# Altium schematic symbol library jlcpcb_2025_04_capacitors_extended_0402.schlib: 3594 symbols (part 7 of 20)
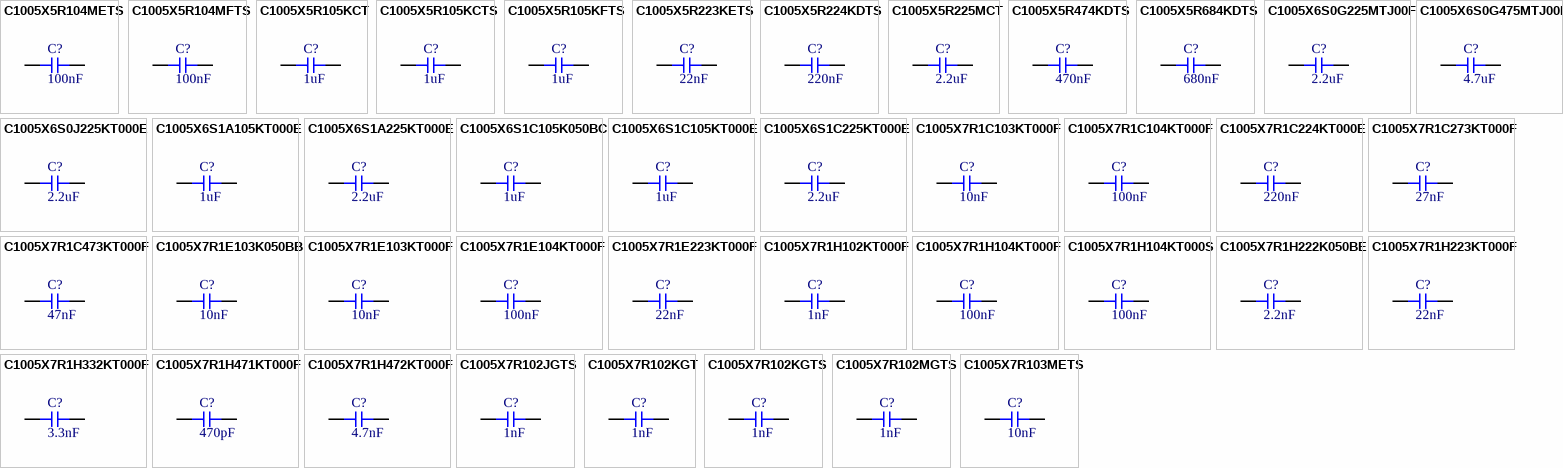
[diagram p95: symbols C1005X5R104METS to C1005X7R103METS]

## C1005X7R1H102KT000F
designator C?  Capacitance: 1nF  (hidden comment: *)
Capacitor, Ceramic (MLCC), 1nF, ±10%, 50V, X7R, ±10%, SMD 0402; Manufacturer: TDK; Manufacturer Part Number: C1005X7R1H102KT000F; Package Size: 0402; JLCPCB Basic Part: No; JLCPCB Part Number: C338013; Supplier 1: LCSC; Category: Capacitors - MLCC; Supplier Part Number 1: C338013; Tolerance: ±10%; Voltage Rating: 50V; Temperature Coefficient: X7R; RoHS: Yes; ComponentLink1Description: Datasheet; ComponentLink1URL: https://wmsc.lcsc.com/wmsc/upload/file/pdf/v2/lcsc/2304140030_TDK-C1005X7R1H102KT000F_C338013.pdf; ComponentLink2Description: JLCPCB Part URL; ComponentLink2URL: https://jlcpcb.com/partdetail/C338013; ComponentLink3Description: LCSC Part URL; ComponentLink3URL: https://lcsc.com/product-detail/Multilayer-Ceramic-Capacitors-MLCC---SMD-SMT_TDK-TDK-C1005X7R1H102KT000F_C338013.html
footprint CAP-0402 (0402 (1005M) Capacitor)
pins: 1, 2

## C1005X7R1H104KT000F
designator C?  Capacitance: 100nF  (hidden comment: *)
Capacitor, Ceramic (MLCC), 100nF, ±10%, 50V, X7R, ±10%, SMD 0402; Manufacturer: TDK; Manufacturer Part Number: C1005X7R1H104KT000F; Package Size: 0402; JLCPCB Basic Part: No; JLCPCB Part Number: C361198; Supplier 1: LCSC; Category: Capacitors - MLCC; Supplier Part Number 1: C361198; Tolerance: ±10%; Voltage Rating: 50V; Temperature Coefficient: X7R; RoHS: Yes; ComponentLink1Description: Datasheet; ComponentLink1URL: https://wmsc.lcsc.com/wmsc/upload/file/pdf/v2/lcsc/2304140030_TDK-C1005X7R1H104KT000F_C361198.pdf; ComponentLink2Description: JLCPCB Part URL; ComponentLink2URL: https://jlcpcb.com/partdetail/C361198; ComponentLink3Description: LCSC Part URL; ComponentLink3URL: https://lcsc.com/product-detail/Multilayer-Ceramic-Capacitors-MLCC---SMD-SMT_TDK-TDK-C1005X7R1H104KT000F_C361198.html
footprint CAP-0402 (0402 (1005M) Capacitor)
pins: 1, 2

## C1005X7R1H104KT000S
designator C?  Capacitance: 100nF  (hidden comment: *)
Capacitor, Ceramic (MLCC), 100nF, ±10%, 50V, X7R, ±10%, SMD 0402; Manufacturer: TDK; Manufacturer Part Number: C1005X7R1H104KT000S; Package Size: 0402; JLCPCB Basic Part: No; JLCPCB Part Number: C432917; Supplier 1: LCSC; Category: Capacitors - MLCC; Supplier Part Number 1: C432917; Tolerance: ±10%; Voltage Rating: 50V; Temperature Coefficient: X7R; RoHS: Yes; ComponentLink1Description: Datasheet; ComponentLink1URL: https://wmsc.lcsc.com/wmsc/upload/file/pdf/v2/lcsc/2304140030_TDK-C1005X7R1H104KT000S_C432917.pdf; ComponentLink2Description: JLCPCB Part URL; ComponentLink2URL: https://jlcpcb.com/partdetail/C432917; ComponentLink3Description: LCSC Part URL; ComponentLink3URL: https://lcsc.com/product-detail/Multilayer-Ceramic-Capacitors-MLCC---SMD-SMT_TDK-TDK-C1005X7R1H104KT000S_C432917.html
footprint CAP-0402 (0402 (1005M) Capacitor)
pins: 1, 2

## C1005X7R1H222K050BE
designator C?  Capacitance: 2.2nF  (hidden comment: *)
Capacitor, Ceramic (MLCC), 2.2nF, ±10%, 50V, X7R, ±10%, SMD 0402; Manufacturer: TDK; Manufacturer Part Number: C1005X7R1H222K050BE; Package Size: 0402; JLCPCB Basic Part: No; JLCPCB Part Number: C189394; Supplier 1: LCSC; Category: Capacitors - MLCC; Supplier Part Number 1: C189394; Tolerance: ±10%; Voltage Rating: 50V; Temperature Coefficient: X7R; RoHS: Yes; ComponentLink1Description: Datasheet; ComponentLink1URL: https://wmsc.lcsc.com/wmsc/upload/file/pdf/v2/lcsc/2304140030_TDK-C1005X7R1H222K050BE_C189394.pdf; ComponentLink2Description: JLCPCB Part URL; ComponentLink2URL: https://jlcpcb.com/partdetail/C189394; ComponentLink3Description: LCSC Part URL; ComponentLink3URL: https://lcsc.com/product-detail/Multilayer-Ceramic-Capacitors-MLCC---SMD-SMT_TDK-TDK-C1005X7R1H222K050BE_C189394.html
footprint CAP-0402 (0402 (1005M) Capacitor)
pins: 1, 2

## C1005X7R1H223KT000F
designator C?  Capacitance: 22nF  (hidden comment: *)
Capacitor, Ceramic (MLCC), 22nF, ±10%, 50V, X7R, ±10%, SMD 0402; Manufacturer: TDK; Manufacturer Part Number: C1005X7R1H223KT000F; Package Size: 0402; JLCPCB Basic Part: No; JLCPCB Part Number: C695127; Supplier 1: LCSC; Category: Capacitors - MLCC; Supplier Part Number 1: C695127; Tolerance: ±10%; Voltage Rating: 50V; Temperature Coefficient: X7R; RoHS: Yes; ComponentLink1Description: Datasheet; ComponentLink1URL: https://wmsc.lcsc.com/wmsc/upload/file/pdf/v2/lcsc/2304140030_TDK-C1005X7R1H223KT000F_C695127.pdf; ComponentLink2Description: JLCPCB Part URL; ComponentLink2URL: https://jlcpcb.com/partdetail/C695127; ComponentLink3Description: LCSC Part URL; ComponentLink3URL: https://lcsc.com/product-detail/Multilayer-Ceramic-Capacitors-MLCC---SMD-SMT_TDK-TDK-C1005X7R1H223KT000F_C695127.html
footprint CAP-0402 (0402 (1005M) Capacitor)
pins: 1, 2

## C1005X7R1H332KT000F
designator C?  Capacitance: 3.3nF  (hidden comment: *)
Capacitor, Ceramic (MLCC), 3.3nF, ±10%, 50V, X7R, ±10%, SMD 0402; Manufacturer: TDK; Manufacturer Part Number: C1005X7R1H332KT000F; Package Size: 0402; JLCPCB Basic Part: No; JLCPCB Part Number: C694172; Supplier 1: LCSC; Category: Capacitors - MLCC; Supplier Part Number 1: C694172; Tolerance: ±10%; Voltage Rating: 50V; Temperature Coefficient: X7R; RoHS: Yes; ComponentLink1Description: Datasheet; ComponentLink1URL: https://wmsc.lcsc.com/wmsc/upload/file/pdf/v2/lcsc/2304140030_TDK-C1005X7R1H332KT000F_C694172.pdf; ComponentLink2Description: JLCPCB Part URL; ComponentLink2URL: https://jlcpcb.com/partdetail/C694172; ComponentLink3Description: LCSC Part URL; ComponentLink3URL: https://lcsc.com/product-detail/Multilayer-Ceramic-Capacitors-MLCC---SMD-SMT_TDK-TDK-C1005X7R1H332KT000F_C694172.html
footprint CAP-0402 (0402 (1005M) Capacitor)
pins: 1, 2

## C1005X7R1H471KT000F
designator C?  Capacitance: 470pF  (hidden comment: *)
Capacitor, Ceramic (MLCC), 470pF, ±10%, 50V, X7R, ±10%, SMD 0402; Manufacturer: TDK; Manufacturer Part Number: C1005X7R1H471KT000F; Package Size: 0402; JLCPCB Basic Part: No; JLCPCB Part Number: C508852; Supplier 1: LCSC; Category: Capacitors - MLCC; Supplier Part Number 1: C508852; Tolerance: ±10%; Voltage Rating: 50V; Temperature Coefficient: X7R; RoHS: Yes; ComponentLink1Description: Datasheet; ComponentLink1URL: https://wmsc.lcsc.com/wmsc/upload/file/pdf/v2/lcsc/2304140030_TDK-C1005X7R1H471KT000F_C508852.pdf; ComponentLink2Description: JLCPCB Part URL; ComponentLink2URL: https://jlcpcb.com/partdetail/C508852; ComponentLink3Description: LCSC Part URL; ComponentLink3URL: https://lcsc.com/product-detail/Multilayer-Ceramic-Capacitors-MLCC---SMD-SMT_TDK-TDK-C1005X7R1H471KT000F_C508852.html
footprint CAP-0402 (0402 (1005M) Capacitor)
pins: 1, 2

## C1005X7R1H472KT000F
designator C?  Capacitance: 4.7nF  (hidden comment: *)
Capacitor, Ceramic (MLCC), 4.7nF, ±10%, 50V, X7R, ±10%, SMD 0402; Manufacturer: TDK; Manufacturer Part Number: C1005X7R1H472KT000F; Package Size: 0402; JLCPCB Basic Part: No; JLCPCB Part Number: C694277; Supplier 1: LCSC; Category: Capacitors - MLCC; Supplier Part Number 1: C694277; Tolerance: ±10%; Voltage Rating: 50V; Temperature Coefficient: X7R; RoHS: Yes; ComponentLink1Description: Datasheet; ComponentLink1URL: https://wmsc.lcsc.com/wmsc/upload/file/pdf/v2/lcsc/2304140030_TDK-C1005X7R1H472KT000F_C694277.pdf; ComponentLink2Description: JLCPCB Part URL; ComponentLink2URL: https://jlcpcb.com/partdetail/C694277; ComponentLink3Description: LCSC Part URL; ComponentLink3URL: https://lcsc.com/product-detail/Multilayer-Ceramic-Capacitors-MLCC---SMD-SMT_TDK-TDK-C1005X7R1H472KT000F_C694277.html
footprint CAP-0402 (0402 (1005M) Capacitor)
pins: 1, 2

## C1005X7R102JGTS
designator C?  Capacitance: 1nF  (hidden comment: *)
Capacitor, Ceramic (MLCC), 1nF, ±5%, 50V, X7R, ±5%, SMD 0402; Manufacturer: Darfon Elec; Manufacturer Part Number: C1005X7R102JGTS; Package Size: 0402; JLCPCB Basic Part: No; JLCPCB Part Number: C147546; Supplier 1: LCSC; Category: Capacitors - MLCC; Supplier Part Number 1: C147546; Tolerance: ±5%; Voltage Rating: 50V; Temperature Coefficient: X7R; RoHS: Yes; ComponentLink1Description: Datasheet; ComponentLink1URL: https://wmsc.lcsc.com/wmsc/upload/file/pdf/v2/lcsc/2304140030_Darfon-Elec-C1005X7R102JGTS_C147546.pdf; ComponentLink2Description: JLCPCB Part URL; ComponentLink2URL: https://jlcpcb.com/partdetail/C147546; ComponentLink3Description: LCSC Part URL; ComponentLink3URL: https://lcsc.com/product-detail/Multilayer-Ceramic-Capacitors-MLCC---SMD-SMT_Darfon-Elec-Darfon-Elec-C1005X7R102JGTS_C147546.html
footprint CAP-0402 (0402 (1005M) Capacitor)
pins: 1, 2

## C1005X7R102KGT
designator C?  Capacitance: 1nF  (hidden comment: *)
Capacitor, Ceramic (MLCC), 1nF, ±10%, 50V, X7R, ±10%, SMD 0402; Manufacturer: Darfon Elec; Manufacturer Part Number: C1005X7R102KGT; Package Size: 0402; JLCPCB Basic Part: No; JLCPCB Part Number: C382729; Supplier 1: LCSC; Category: Capacitors - MLCC; Supplier Part Number 1: C382729; Tolerance: ±10%; Voltage Rating: 50V; Temperature Coefficient: X7R; RoHS: Yes; ComponentLink1Description: Datasheet; ComponentLink1URL: https://wmsc.lcsc.com/wmsc/upload/file/pdf/v2/lcsc/2304140030_Darfon-Elec-C1005X7R102KGT_C382729.pdf; ComponentLink2Description: JLCPCB Part URL; ComponentLink2URL: https://jlcpcb.com/partdetail/C382729; ComponentLink3Description: LCSC Part URL; ComponentLink3URL: https://lcsc.com/product-detail/Multilayer-Ceramic-Capacitors-MLCC---SMD-SMT_Darfon-Elec-Darfon-Elec-C1005X7R102KGT_C382729.html
footprint CAP-0402 (0402 (1005M) Capacitor)
pins: 1, 2

## C1005X7R102KGTS
designator C?  Capacitance: 1nF  (hidden comment: *)
Capacitor, Ceramic (MLCC), 1nF, ±10%, 50V, X7R, ±10%, SMD 0402; Manufacturer: Darfon Elec; Manufacturer Part Number: C1005X7R102KGTS; Package Size: 0402; JLCPCB Basic Part: No; JLCPCB Part Number: C147545; Supplier 1: LCSC; Category: Capacitors - MLCC; Supplier Part Number 1: C147545; Tolerance: ±10%; Voltage Rating: 50V; Temperature Coefficient: X7R; RoHS: Yes; ComponentLink1Description: Datasheet; ComponentLink1URL: https://wmsc.lcsc.com/wmsc/upload/file/pdf/v2/lcsc/2304140030_Darfon-Elec-C1005X7R102KGTS_C147545.pdf; ComponentLink2Description: JLCPCB Part URL; ComponentLink2URL: https://jlcpcb.com/partdetail/C147545; ComponentLink3Description: LCSC Part URL; ComponentLink3URL: https://lcsc.com/product-detail/Multilayer-Ceramic-Capacitors-MLCC---SMD-SMT_Darfon-Elec-Darfon-Elec-C1005X7R102KGTS_C147545.html
footprint CAP-0402 (0402 (1005M) Capacitor)
pins: 1, 2

## C1005X7R102MGTS
designator C?  Capacitance: 1nF  (hidden comment: *)
Capacitor, Ceramic (MLCC), 1nF, ±20%, 50V, X7R, ±20%, SMD 0402; Manufacturer: Darfon Elec; Manufacturer Part Number: C1005X7R102MGTS; Package Size: 0402; JLCPCB Basic Part: No; JLCPCB Part Number: C267410; Supplier 1: LCSC; Category: Capacitors - MLCC; Supplier Part Number 1: C267410; Tolerance: ±20%; Voltage Rating: 50V; Temperature Coefficient: X7R; RoHS: Yes; ComponentLink1Description: Datasheet; ComponentLink1URL: https://wmsc.lcsc.com/wmsc/upload/file/pdf/v2/lcsc/2304140030_Darfon-Elec-C1005X7R102MGTS_C267410.pdf; ComponentLink2Description: JLCPCB Part URL; ComponentLink2URL: https://jlcpcb.com/partdetail/C267410; ComponentLink3Description: LCSC Part URL; ComponentLink3URL: https://lcsc.com/product-detail/Multilayer-Ceramic-Capacitors-MLCC---SMD-SMT_Darfon-Elec-Darfon-Elec-C1005X7R102MGTS_C267410.html
footprint CAP-0402 (0402 (1005M) Capacitor)
pins: 1, 2

## C1005X7R103METS
designator C?  Capacitance: 10nF  (hidden comment: *)
Capacitor, Ceramic (MLCC), 10nF, ±20%, 16V, X7R, ±20%, SMD 0402; Manufacturer: Darfon Elec; Manufacturer Part Number: C1005X7R103METS; Package Size: 0402; JLCPCB Basic Part: No; JLCPCB Part Number: C312125; Supplier 1: LCSC; Category: Capacitors - MLCC; Supplier Part Number 1: C312125; Tolerance: ±20%; Voltage Rating: 16V; Temperature Coefficient: X7R; RoHS: Yes; ComponentLink1Description: Datasheet; ComponentLink1URL: https://wmsc.lcsc.com/wmsc/upload/file/pdf/v2/lcsc/2304140030_Darfon-Elec-C1005X7R103METS_C312125.pdf; ComponentLink2Description: JLCPCB Part URL; ComponentLink2URL: https://jlcpcb.com/partdetail/C312125; ComponentLink3Description: LCSC Part URL; ComponentLink3URL: https://lcsc.com/product-detail/Multilayer-Ceramic-Capacitors-MLCC---SMD-SMT_Darfon-Elec-Darfon-Elec-C1005X7R103METS_C312125.html
footprint CAP-0402 (0402 (1005M) Capacitor)
pins: 1, 2

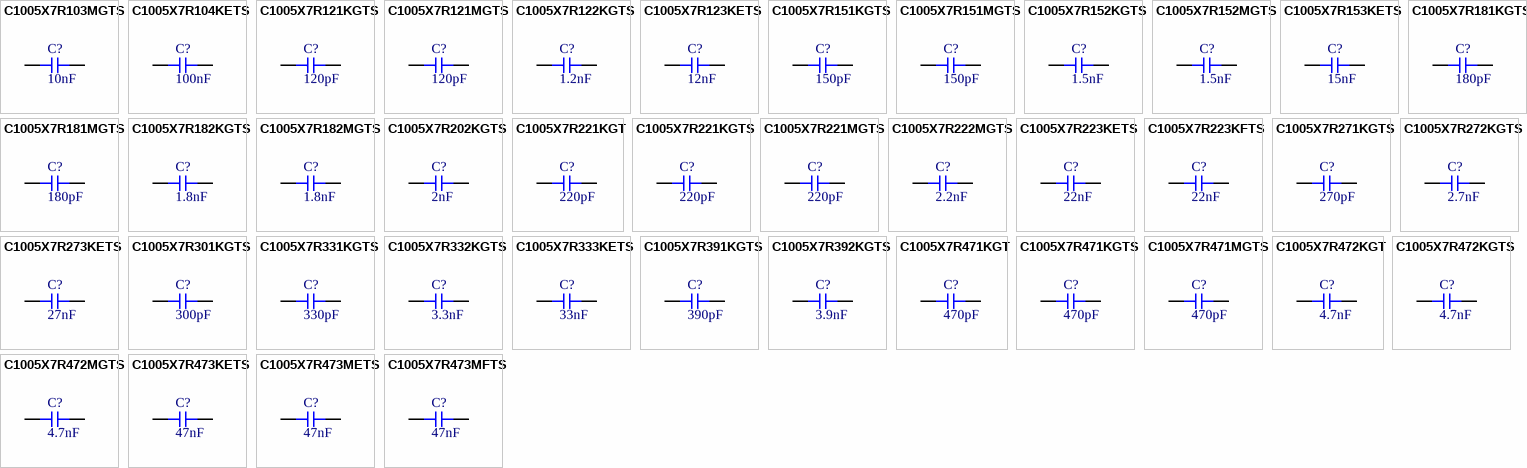
[diagram p28: symbols C1005X7R103MGTS to C1005X7R473MFTS]

## C1005X7R103MGTS
designator C?  Capacitance: 10nF  (hidden comment: *)
Capacitor, Ceramic (MLCC), 10nF, ±20%, 50V, X7R, ±20%, SMD 0402; Manufacturer: Darfon Elec; Manufacturer Part Number: C1005X7R103MGTS; Package Size: 0402; JLCPCB Basic Part: No; JLCPCB Part Number: C267411; Supplier 1: LCSC; Category: Capacitors - MLCC; Supplier Part Number 1: C267411; Tolerance: ±20%; Voltage Rating: 50V; Temperature Coefficient: X7R; RoHS: Yes; ComponentLink1Description: Datasheet; ComponentLink1URL: https://wmsc.lcsc.com/wmsc/upload/file/pdf/v2/lcsc/2304140030_Darfon-Elec-C1005X7R103MGTS_C267411.pdf; ComponentLink2Description: JLCPCB Part URL; ComponentLink2URL: https://jlcpcb.com/partdetail/C267411; ComponentLink3Description: LCSC Part URL; ComponentLink3URL: https://lcsc.com/product-detail/Multilayer-Ceramic-Capacitors-MLCC---SMD-SMT_Darfon-Elec-Darfon-Elec-C1005X7R103MGTS_C267411.html
footprint CAP-0402 (0402 (1005M) Capacitor)
pins: 1, 2

## C1005X7R104KETS
designator C?  Capacitance: 100nF  (hidden comment: *)
Capacitor, Ceramic (MLCC), 100nF, ±10%, 16V, X7R, ±10%, SMD 0402; Manufacturer: Darfon Elec; Manufacturer Part Number: C1005X7R104KETS; Package Size: 0402; JLCPCB Basic Part: No; JLCPCB Part Number: C258508; Supplier 1: LCSC; Category: Capacitors - MLCC; Supplier Part Number 1: C258508; Tolerance: ±10%; Voltage Rating: 16V; Temperature Coefficient: X7R; RoHS: Yes; ComponentLink1Description: Datasheet; ComponentLink1URL: https://wmsc.lcsc.com/wmsc/upload/file/pdf/v2/lcsc/2304140030_Darfon-Elec-C1005X7R104KETS_C258508.pdf; ComponentLink2Description: JLCPCB Part URL; ComponentLink2URL: https://jlcpcb.com/partdetail/C258508; ComponentLink3Description: LCSC Part URL; ComponentLink3URL: https://lcsc.com/product-detail/Multilayer-Ceramic-Capacitors-MLCC---SMD-SMT_Darfon-Elec-Darfon-Elec-C1005X7R104KETS_C258508.html
footprint CAP-0402 (0402 (1005M) Capacitor)
pins: 1, 2

## C1005X7R121KGTS
designator C?  Capacitance: 120pF  (hidden comment: *)
Capacitor, Ceramic (MLCC), 120pF, ±10%, 50V, X7R, ±10%, SMD 0402; Manufacturer: Darfon Elec; Manufacturer Part Number: C1005X7R121KGTS; Package Size: 0402; JLCPCB Basic Part: No; JLCPCB Part Number: C147501; Supplier 1: LCSC; Category: Capacitors - MLCC; Supplier Part Number 1: C147501; Tolerance: ±10%; Voltage Rating: 50V; Temperature Coefficient: X7R; RoHS: Yes; ComponentLink1Description: Datasheet; ComponentLink1URL: https://wmsc.lcsc.com/wmsc/upload/file/pdf/v2/lcsc/2304140030_Darfon-Elec-C1005X7R121KGTS_C147501.pdf; ComponentLink2Description: JLCPCB Part URL; ComponentLink2URL: https://jlcpcb.com/partdetail/C147501; ComponentLink3Description: LCSC Part URL; ComponentLink3URL: https://lcsc.com/product-detail/Multilayer-Ceramic-Capacitors-MLCC---SMD-SMT_Darfon-Elec-Darfon-Elec-C1005X7R121KGTS_C147501.html
footprint CAP-0402 (0402 (1005M) Capacitor)
pins: 1, 2

## C1005X7R121MGTS
designator C?  Capacitance: 120pF  (hidden comment: *)
Capacitor, Ceramic (MLCC), 120pF, ±20%, 50V, X7R, ±20%, SMD 0402; Manufacturer: Darfon Elec; Manufacturer Part Number: C1005X7R121MGTS; Package Size: 0402; JLCPCB Basic Part: No; JLCPCB Part Number: C312114; Supplier 1: LCSC; Category: Capacitors - MLCC; Supplier Part Number 1: C312114; Tolerance: ±20%; Voltage Rating: 50V; Temperature Coefficient: X7R; RoHS: Yes; ComponentLink1Description: Datasheet; ComponentLink1URL: https://wmsc.lcsc.com/wmsc/upload/file/pdf/v2/lcsc/2304140030_Darfon-Elec-C1005X7R121MGTS_C312114.pdf; ComponentLink2Description: JLCPCB Part URL; ComponentLink2URL: https://jlcpcb.com/partdetail/C312114; ComponentLink3Description: LCSC Part URL; ComponentLink3URL: https://lcsc.com/product-detail/Multilayer-Ceramic-Capacitors-MLCC---SMD-SMT_Darfon-Elec-Darfon-Elec-C1005X7R121MGTS_C312114.html
footprint CAP-0402 (0402 (1005M) Capacitor)
pins: 1, 2

## C1005X7R122KGTS
designator C?  Capacitance: 1.2nF  (hidden comment: *)
Capacitor, Ceramic (MLCC), 1.2nF, ±10%, 50V, X7R, ±10%, SMD 0402; Manufacturer: Darfon Elec; Manufacturer Part Number: C1005X7R122KGTS; Package Size: 0402; JLCPCB Basic Part: No; JLCPCB Part Number: C147551; Supplier 1: LCSC; Category: Capacitors - MLCC; Supplier Part Number 1: C147551; Tolerance: ±10%; Voltage Rating: 50V; Temperature Coefficient: X7R; RoHS: Yes; ComponentLink1Description: Datasheet; ComponentLink1URL: https://wmsc.lcsc.com/wmsc/upload/file/pdf/v2/lcsc/2304140030_Darfon-Elec-C1005X7R122KGTS_C147551.pdf; ComponentLink2Description: JLCPCB Part URL; ComponentLink2URL: https://jlcpcb.com/partdetail/C147551; ComponentLink3Description: LCSC Part URL; ComponentLink3URL: https://lcsc.com/product-detail/Multilayer-Ceramic-Capacitors-MLCC---SMD-SMT_Darfon-Elec-Darfon-Elec-C1005X7R122KGTS_C147551.html
footprint CAP-0402 (0402 (1005M) Capacitor)
pins: 1, 2

## C1005X7R123KETS
designator C?  Capacitance: 12nF  (hidden comment: *)
Capacitor, Ceramic (MLCC), 12nF, ±10%, 16V, X7R, ±10%, SMD 0402; Manufacturer: Darfon Elec; Manufacturer Part Number: C1005X7R123KETS; Package Size: 0402; JLCPCB Basic Part: No; JLCPCB Part Number: C147605; Supplier 1: LCSC; Category: Capacitors - MLCC; Supplier Part Number 1: C147605; Tolerance: ±10%; Voltage Rating: 16V; Temperature Coefficient: X7R; RoHS: Yes; ComponentLink1Description: Datasheet; ComponentLink1URL: https://wmsc.lcsc.com/wmsc/upload/file/pdf/v2/lcsc/2304140030_Darfon-Elec-C1005X7R123KETS_C147605.pdf; ComponentLink2Description: JLCPCB Part URL; ComponentLink2URL: https://jlcpcb.com/partdetail/C147605; ComponentLink3Description: LCSC Part URL; ComponentLink3URL: https://lcsc.com/product-detail/Multilayer-Ceramic-Capacitors-MLCC---SMD-SMT_Darfon-Elec-Darfon-Elec-C1005X7R123KETS_C147605.html
footprint CAP-0402 (0402 (1005M) Capacitor)
pins: 1, 2

## C1005X7R151KGTS
designator C?  Capacitance: 150pF  (hidden comment: *)
Capacitor, Ceramic (MLCC), 150pF, ±10%, 50V, X7R, ±10%, SMD 0402; Manufacturer: Darfon Elec; Manufacturer Part Number: C1005X7R151KGTS; Package Size: 0402; JLCPCB Basic Part: No; JLCPCB Part Number: C147505; Supplier 1: LCSC; Category: Capacitors - MLCC; Supplier Part Number 1: C147505; Tolerance: ±10%; Voltage Rating: 50V; Temperature Coefficient: X7R; RoHS: Yes; ComponentLink1Description: Datasheet; ComponentLink1URL: https://wmsc.lcsc.com/wmsc/upload/file/pdf/v2/lcsc/2304140030_Darfon-Elec-C1005X7R151KGTS_C147505.pdf; ComponentLink2Description: JLCPCB Part URL; ComponentLink2URL: https://jlcpcb.com/partdetail/C147505; ComponentLink3Description: LCSC Part URL; ComponentLink3URL: https://lcsc.com/product-detail/Multilayer-Ceramic-Capacitors-MLCC---SMD-SMT_Darfon-Elec-Darfon-Elec-C1005X7R151KGTS_C147505.html
footprint CAP-0402 (0402 (1005M) Capacitor)
pins: 1, 2

## C1005X7R151MGTS
designator C?  Capacitance: 150pF  (hidden comment: *)
Capacitor, Ceramic (MLCC), 150pF, ±20%, 50V, X7R, ±20%, SMD 0402; Manufacturer: Darfon Elec; Manufacturer Part Number: C1005X7R151MGTS; Package Size: 0402; JLCPCB Basic Part: No; JLCPCB Part Number: C312106; Supplier 1: LCSC; Category: Capacitors - MLCC; Supplier Part Number 1: C312106; Tolerance: ±20%; Voltage Rating: 50V; Temperature Coefficient: X7R; RoHS: Yes; ComponentLink1Description: Datasheet; ComponentLink1URL: https://wmsc.lcsc.com/wmsc/upload/file/pdf/v2/lcsc/2304140030_Darfon-Elec-C1005X7R151MGTS_C312106.pdf; ComponentLink2Description: JLCPCB Part URL; ComponentLink2URL: https://jlcpcb.com/partdetail/C312106; ComponentLink3Description: LCSC Part URL; ComponentLink3URL: https://lcsc.com/product-detail/Multilayer-Ceramic-Capacitors-MLCC---SMD-SMT_Darfon-Elec-Darfon-Elec-C1005X7R151MGTS_C312106.html
footprint CAP-0402 (0402 (1005M) Capacitor)
pins: 1, 2

## C1005X7R152KGTS
designator C?  Capacitance: 1.5nF  (hidden comment: *)
Capacitor, Ceramic (MLCC), 1.5nF, ±10%, 50V, X7R, ±10%, SMD 0402; Manufacturer: Darfon Elec; Manufacturer Part Number: C1005X7R152KGTS; Package Size: 0402; JLCPCB Basic Part: No; JLCPCB Part Number: C147555; Supplier 1: LCSC; Category: Capacitors - MLCC; Supplier Part Number 1: C147555; Tolerance: ±10%; Voltage Rating: 50V; Temperature Coefficient: X7R; RoHS: Yes; ComponentLink1Description: Datasheet; ComponentLink1URL: https://wmsc.lcsc.com/wmsc/upload/file/pdf/v2/lcsc/2304140030_Darfon-Elec-C1005X7R152KGTS_C147555.pdf; ComponentLink2Description: JLCPCB Part URL; ComponentLink2URL: https://jlcpcb.com/partdetail/C147555; ComponentLink3Description: LCSC Part URL; ComponentLink3URL: https://lcsc.com/product-detail/Multilayer-Ceramic-Capacitors-MLCC---SMD-SMT_Darfon-Elec-Darfon-Elec-C1005X7R152KGTS_C147555.html
footprint CAP-0402 (0402 (1005M) Capacitor)
pins: 1, 2

## C1005X7R152MGTS
designator C?  Capacitance: 1.5nF  (hidden comment: *)
Capacitor, Ceramic (MLCC), 1.5nF, ±20%, 50V, X7R, ±20%, SMD 0402; Manufacturer: Darfon Elec; Manufacturer Part Number: C1005X7R152MGTS; Package Size: 0402; JLCPCB Basic Part: No; JLCPCB Part Number: C267412; Supplier 1: LCSC; Category: Capacitors - MLCC; Supplier Part Number 1: C267412; Tolerance: ±20%; Voltage Rating: 50V; Temperature Coefficient: X7R; RoHS: Yes; ComponentLink1Description: Datasheet; ComponentLink1URL: https://wmsc.lcsc.com/wmsc/upload/file/pdf/v2/lcsc/2304140030_Darfon-Elec-C1005X7R152MGTS_C267412.pdf; ComponentLink2Description: JLCPCB Part URL; ComponentLink2URL: https://jlcpcb.com/partdetail/C267412; ComponentLink3Description: LCSC Part URL; ComponentLink3URL: https://lcsc.com/product-detail/Multilayer-Ceramic-Capacitors-MLCC---SMD-SMT_Darfon-Elec-Darfon-Elec-C1005X7R152MGTS_C267412.html
footprint CAP-0402 (0402 (1005M) Capacitor)
pins: 1, 2

## C1005X7R153KETS
designator C?  Capacitance: 15nF  (hidden comment: *)
Capacitor, Ceramic (MLCC), 15nF, ±10%, 16V, X7R, ±10%, SMD 0402; Manufacturer: Darfon Elec; Manufacturer Part Number: C1005X7R153KETS; Package Size: 0402; JLCPCB Basic Part: No; JLCPCB Part Number: C147609; Supplier 1: LCSC; Category: Capacitors - MLCC; Supplier Part Number 1: C147609; Tolerance: ±10%; Voltage Rating: 16V; Temperature Coefficient: X7R; RoHS: Yes; ComponentLink1Description: Datasheet; ComponentLink1URL: https://wmsc.lcsc.com/wmsc/upload/file/pdf/v2/lcsc/2304140030_Darfon-Elec-C1005X7R153KETS_C147609.pdf; ComponentLink2Description: JLCPCB Part URL; ComponentLink2URL: https://jlcpcb.com/partdetail/C147609; ComponentLink3Description: LCSC Part URL; ComponentLink3URL: https://lcsc.com/product-detail/Multilayer-Ceramic-Capacitors-MLCC---SMD-SMT_Darfon-Elec-Darfon-Elec-C1005X7R153KETS_C147609.html
footprint CAP-0402 (0402 (1005M) Capacitor)
pins: 1, 2

## C1005X7R181KGTS
designator C?  Capacitance: 180pF  (hidden comment: *)
Capacitor, Ceramic (MLCC), 180pF, ±10%, 50V, X7R, ±10%, SMD 0402; Manufacturer: Darfon Elec; Manufacturer Part Number: C1005X7R181KGTS; Package Size: 0402; JLCPCB Basic Part: No; JLCPCB Part Number: C147509; Supplier 1: LCSC; Category: Capacitors - MLCC; Supplier Part Number 1: C147509; Tolerance: ±10%; Voltage Rating: 50V; Temperature Coefficient: X7R; RoHS: Yes; ComponentLink1Description: Datasheet; ComponentLink1URL: https://wmsc.lcsc.com/wmsc/upload/file/pdf/v2/lcsc/2304140030_Darfon-Elec-C1005X7R181KGTS_C147509.pdf; ComponentLink2Description: JLCPCB Part URL; ComponentLink2URL: https://jlcpcb.com/partdetail/C147509; ComponentLink3Description: LCSC Part URL; ComponentLink3URL: https://lcsc.com/product-detail/Multilayer-Ceramic-Capacitors-MLCC---SMD-SMT_Darfon-Elec-Darfon-Elec-C1005X7R181KGTS_C147509.html
footprint CAP-0402 (0402 (1005M) Capacitor)
pins: 1, 2

## C1005X7R181MGTS
designator C?  Capacitance: 180pF  (hidden comment: *)
Capacitor, Ceramic (MLCC), 180pF, ±20%, 50V, X7R, ±20%, SMD 0402; Manufacturer: Darfon Elec; Manufacturer Part Number: C1005X7R181MGTS; Package Size: 0402; JLCPCB Basic Part: No; JLCPCB Part Number: C312091; Supplier 1: LCSC; Category: Capacitors - MLCC; Supplier Part Number 1: C312091; Tolerance: ±20%; Voltage Rating: 50V; Temperature Coefficient: X7R; RoHS: Yes; ComponentLink1Description: Datasheet; ComponentLink1URL: https://wmsc.lcsc.com/wmsc/upload/file/pdf/v2/lcsc/2304140030_Darfon-Elec-C1005X7R181MGTS_C312091.pdf; ComponentLink2Description: JLCPCB Part URL; ComponentLink2URL: https://jlcpcb.com/partdetail/C312091; ComponentLink3Description: LCSC Part URL; ComponentLink3URL: https://lcsc.com/product-detail/Multilayer-Ceramic-Capacitors-MLCC---SMD-SMT_Darfon-Elec-Darfon-Elec-C1005X7R181MGTS_C312091.html
footprint CAP-0402 (0402 (1005M) Capacitor)
pins: 1, 2

## C1005X7R182KGTS
designator C?  Capacitance: 1.8nF  (hidden comment: *)
Capacitor, Ceramic (MLCC), 1.8nF, ±10%, 50V, X7R, ±10%, SMD 0402; Manufacturer: Darfon Elec; Manufacturer Part Number: C1005X7R182KGTS; Package Size: 0402; JLCPCB Basic Part: No; JLCPCB Part Number: C147559; Supplier 1: LCSC; Category: Capacitors - MLCC; Supplier Part Number 1: C147559; Tolerance: ±10%; Voltage Rating: 50V; Temperature Coefficient: X7R; RoHS: Yes; ComponentLink1Description: Datasheet; ComponentLink1URL: https://wmsc.lcsc.com/wmsc/upload/file/pdf/v2/lcsc/2304140030_Darfon-Elec-C1005X7R182KGTS_C147559.pdf; ComponentLink2Description: JLCPCB Part URL; ComponentLink2URL: https://jlcpcb.com/partdetail/C147559; ComponentLink3Description: LCSC Part URL; ComponentLink3URL: https://lcsc.com/product-detail/Multilayer-Ceramic-Capacitors-MLCC---SMD-SMT_Darfon-Elec-Darfon-Elec-C1005X7R182KGTS_C147559.html
footprint CAP-0402 (0402 (1005M) Capacitor)
pins: 1, 2

## C1005X7R182MGTS
designator C?  Capacitance: 1.8nF  (hidden comment: *)
Capacitor, Ceramic (MLCC), 1.8nF, ±20%, 50V, X7R, ±20%, SMD 0402; Manufacturer: Darfon Elec; Manufacturer Part Number: C1005X7R182MGTS; Package Size: 0402; JLCPCB Basic Part: No; JLCPCB Part Number: C312090; Supplier 1: LCSC; Category: Capacitors - MLCC; Supplier Part Number 1: C312090; Tolerance: ±20%; Voltage Rating: 50V; Temperature Coefficient: X7R; RoHS: Yes; ComponentLink1Description: Datasheet; ComponentLink1URL: https://wmsc.lcsc.com/wmsc/upload/file/pdf/v2/lcsc/2304140030_Darfon-Elec-C1005X7R182MGTS_C312090.pdf; ComponentLink2Description: JLCPCB Part URL; ComponentLink2URL: https://jlcpcb.com/partdetail/C312090; ComponentLink3Description: LCSC Part URL; ComponentLink3URL: https://lcsc.com/product-detail/Multilayer-Ceramic-Capacitors-MLCC---SMD-SMT_Darfon-Elec-Darfon-Elec-C1005X7R182MGTS_C312090.html
footprint CAP-0402 (0402 (1005M) Capacitor)
pins: 1, 2

## C1005X7R202KGTS
designator C?  Capacitance: 2nF  (hidden comment: *)
Capacitor, Ceramic (MLCC), 2nF, ±10%, 50V, X7R, ±10%, SMD 0402; Manufacturer: Darfon Elec; Manufacturer Part Number: C1005X7R202KGTS; Package Size: 0402; JLCPCB Basic Part: No; JLCPCB Part Number: C267413; Supplier 1: LCSC; Category: Capacitors - MLCC; Supplier Part Number 1: C267413; Tolerance: ±10%; Voltage Rating: 50V; Temperature Coefficient: X7R; RoHS: Yes; ComponentLink1Description: Datasheet; ComponentLink1URL: https://wmsc.lcsc.com/wmsc/upload/file/pdf/v2/lcsc/2304140030_Darfon-Elec-C1005X7R202KGTS_C267413.pdf; ComponentLink2Description: JLCPCB Part URL; ComponentLink2URL: https://jlcpcb.com/partdetail/C267413; ComponentLink3Description: LCSC Part URL; ComponentLink3URL: https://lcsc.com/product-detail/Multilayer-Ceramic-Capacitors-MLCC---SMD-SMT_Darfon-Elec-Darfon-Elec-C1005X7R202KGTS_C267413.html
footprint CAP-0402 (0402 (1005M) Capacitor)
pins: 1, 2

## C1005X7R221KGT
designator C?  Capacitance: 220pF  (hidden comment: *)
Capacitor, Ceramic (MLCC), 220pF, ±10%, 50V, X7R, ±10%, SMD 0402; Manufacturer: Darfon Elec; Manufacturer Part Number: C1005X7R221KGT; Package Size: 0402; JLCPCB Basic Part: No; JLCPCB Part Number: C424337; Supplier 1: LCSC; Category: Capacitors - MLCC; Supplier Part Number 1: C424337; Tolerance: ±10%; Voltage Rating: 50V; Temperature Coefficient: X7R; RoHS: Yes; ComponentLink1Description: Datasheet; ComponentLink1URL: https://wmsc.lcsc.com/wmsc/upload/file/pdf/v2/lcsc/2304140030_Darfon-Elec-C1005X7R221KGT_C424337.pdf; ComponentLink2Description: JLCPCB Part URL; ComponentLink2URL: https://jlcpcb.com/partdetail/C424337; ComponentLink3Description: LCSC Part URL; ComponentLink3URL: https://lcsc.com/product-detail/Multilayer-Ceramic-Capacitors-MLCC---SMD-SMT_Darfon-Elec-Darfon-Elec-C1005X7R221KGT_C424337.html
footprint CAP-0402 (0402 (1005M) Capacitor)
pins: 1, 2

## C1005X7R221KGTS
designator C?  Capacitance: 220pF  (hidden comment: *)
Capacitor, Ceramic (MLCC), 220pF, ±10%, 50V, X7R, ±10%, SMD 0402; Manufacturer: Darfon Elec; Manufacturer Part Number: C1005X7R221KGTS; Package Size: 0402; JLCPCB Basic Part: No; JLCPCB Part Number: C147513; Supplier 1: LCSC; Category: Capacitors - MLCC; Supplier Part Number 1: C147513; Tolerance: ±10%; Voltage Rating: 50V; Temperature Coefficient: X7R; RoHS: Yes; ComponentLink1Description: Datasheet; ComponentLink1URL: https://wmsc.lcsc.com/wmsc/upload/file/pdf/v2/lcsc/2304140030_Darfon-Elec-C1005X7R221KGTS_C147513.pdf; ComponentLink2Description: JLCPCB Part URL; ComponentLink2URL: https://jlcpcb.com/partdetail/C147513; ComponentLink3Description: LCSC Part URL; ComponentLink3URL: https://lcsc.com/product-detail/Multilayer-Ceramic-Capacitors-MLCC---SMD-SMT_Darfon-Elec-Darfon-Elec-C1005X7R221KGTS_C147513.html
footprint CAP-0402 (0402 (1005M) Capacitor)
pins: 1, 2

## C1005X7R221MGTS
designator C?  Capacitance: 220pF  (hidden comment: *)
Capacitor, Ceramic (MLCC), 220pF, ±20%, 50V, X7R, ±20%, SMD 0402; Manufacturer: Darfon Elec; Manufacturer Part Number: C1005X7R221MGTS; Package Size: 0402; JLCPCB Basic Part: No; JLCPCB Part Number: C267414; Supplier 1: LCSC; Category: Capacitors - MLCC; Supplier Part Number 1: C267414; Tolerance: ±20%; Voltage Rating: 50V; Temperature Coefficient: X7R; RoHS: Yes; ComponentLink1Description: Datasheet; ComponentLink1URL: https://wmsc.lcsc.com/wmsc/upload/file/pdf/v2/lcsc/2304140030_Darfon-Elec-C1005X7R221MGTS_C267414.pdf; ComponentLink2Description: JLCPCB Part URL; ComponentLink2URL: https://jlcpcb.com/partdetail/C267414; ComponentLink3Description: LCSC Part URL; ComponentLink3URL: https://lcsc.com/product-detail/Multilayer-Ceramic-Capacitors-MLCC---SMD-SMT_Darfon-Elec-Darfon-Elec-C1005X7R221MGTS_C267414.html
footprint CAP-0402 (0402 (1005M) Capacitor)
pins: 1, 2

## C1005X7R222MGTS
designator C?  Capacitance: 2.2nF  (hidden comment: *)
Capacitor, Ceramic (MLCC), 2.2nF, ±20%, 50V, X7R, ±20%, SMD 0402; Manufacturer: Darfon Elec; Manufacturer Part Number: C1005X7R222MGTS; Package Size: 0402; JLCPCB Basic Part: No; JLCPCB Part Number: C267415; Supplier 1: LCSC; Category: Capacitors - MLCC; Supplier Part Number 1: C267415; Tolerance: ±20%; Voltage Rating: 50V; Temperature Coefficient: X7R; RoHS: Yes; ComponentLink1Description: Datasheet; ComponentLink1URL: https://wmsc.lcsc.com/wmsc/upload/file/pdf/v2/lcsc/2304140030_Darfon-Elec-C1005X7R222MGTS_C267415.pdf; ComponentLink2Description: JLCPCB Part URL; ComponentLink2URL: https://jlcpcb.com/partdetail/C267415; ComponentLink3Description: LCSC Part URL; ComponentLink3URL: https://lcsc.com/product-detail/Multilayer-Ceramic-Capacitors-MLCC---SMD-SMT_Darfon-Elec-Darfon-Elec-C1005X7R222MGTS_C267415.html
footprint CAP-0402 (0402 (1005M) Capacitor)
pins: 1, 2

## C1005X7R223KETS
designator C?  Capacitance: 22nF  (hidden comment: *)
Capacitor, Ceramic (MLCC), 22nF, ±10%, 16V, X7R, ±10%, SMD 0402; Manufacturer: Darfon Elec; Manufacturer Part Number: C1005X7R223KETS; Package Size: 0402; JLCPCB Basic Part: No; JLCPCB Part Number: C147616; Supplier 1: LCSC; Category: Capacitors - MLCC; Supplier Part Number 1: C147616; Tolerance: ±10%; Voltage Rating: 16V; Temperature Coefficient: X7R; RoHS: Yes; ComponentLink1Description: Datasheet; ComponentLink1URL: https://wmsc.lcsc.com/wmsc/upload/file/pdf/v2/lcsc/2304140030_Darfon-Elec-C1005X7R223KETS_C147616.pdf; ComponentLink2Description: JLCPCB Part URL; ComponentLink2URL: https://jlcpcb.com/partdetail/C147616; ComponentLink3Description: LCSC Part URL; ComponentLink3URL: https://lcsc.com/product-detail/Multilayer-Ceramic-Capacitors-MLCC---SMD-SMT_Darfon-Elec-Darfon-Elec-C1005X7R223KETS_C147616.html
footprint CAP-0402 (0402 (1005M) Capacitor)
pins: 1, 2

## C1005X7R223KFTS
designator C?  Capacitance: 22nF  (hidden comment: *)
Capacitor, Ceramic (MLCC), 22nF, ±10%, 25V, X7R, ±10%, SMD 0402; Manufacturer: Darfon Elec; Manufacturer Part Number: C1005X7R223KFTS; Package Size: 0402; JLCPCB Basic Part: No; JLCPCB Part Number: C147615; Supplier 1: LCSC; Category: Capacitors - MLCC; Supplier Part Number 1: C147615; Tolerance: ±10%; Voltage Rating: 25V; Temperature Coefficient: X7R; RoHS: Yes; ComponentLink1Description: Datasheet; ComponentLink1URL: https://wmsc.lcsc.com/wmsc/upload/file/pdf/v2/lcsc/2304140030_Darfon-Elec-C1005X7R223KFTS_C147615.pdf; ComponentLink2Description: JLCPCB Part URL; ComponentLink2URL: https://jlcpcb.com/partdetail/C147615; ComponentLink3Description: LCSC Part URL; ComponentLink3URL: https://lcsc.com/product-detail/Multilayer-Ceramic-Capacitors-MLCC---SMD-SMT_Darfon-Elec-Darfon-Elec-C1005X7R223KFTS_C147615.html
footprint CAP-0402 (0402 (1005M) Capacitor)
pins: 1, 2

## C1005X7R271KGTS
designator C?  Capacitance: 270pF  (hidden comment: *)
Capacitor, Ceramic (MLCC), 270pF, ±10%, 50V, X7R, ±10%, SMD 0402; Manufacturer: Darfon Elec; Manufacturer Part Number: C1005X7R271KGTS; Package Size: 0402; JLCPCB Basic Part: No; JLCPCB Part Number: C147517; Supplier 1: LCSC; Category: Capacitors - MLCC; Supplier Part Number 1: C147517; Tolerance: ±10%; Voltage Rating: 50V; Temperature Coefficient: X7R; RoHS: Yes; ComponentLink1Description: Datasheet; ComponentLink1URL: https://wmsc.lcsc.com/wmsc/upload/file/pdf/v2/lcsc/2304140030_Darfon-Elec-C1005X7R271KGTS_C147517.pdf; ComponentLink2Description: JLCPCB Part URL; ComponentLink2URL: https://jlcpcb.com/partdetail/C147517; ComponentLink3Description: LCSC Part URL; ComponentLink3URL: https://lcsc.com/product-detail/Multilayer-Ceramic-Capacitors-MLCC---SMD-SMT_Darfon-Elec-Darfon-Elec-C1005X7R271KGTS_C147517.html
footprint CAP-0402 (0402 (1005M) Capacitor)
pins: 1, 2

## C1005X7R272KGTS
designator C?  Capacitance: 2.7nF  (hidden comment: *)
Capacitor, Ceramic (MLCC), 2.7nF, ±10%, 50V, X7R, ±10%, SMD 0402; Manufacturer: Darfon Elec; Manufacturer Part Number: C1005X7R272KGTS; Package Size: 0402; JLCPCB Basic Part: No; JLCPCB Part Number: C147568; Supplier 1: LCSC; Category: Capacitors - MLCC; Supplier Part Number 1: C147568; Tolerance: ±10%; Voltage Rating: 50V; Temperature Coefficient: X7R; RoHS: Yes; ComponentLink1Description: Datasheet; ComponentLink1URL: https://wmsc.lcsc.com/wmsc/upload/file/pdf/v2/lcsc/2304140030_Darfon-Elec-C1005X7R272KGTS_C147568.pdf; ComponentLink2Description: JLCPCB Part URL; ComponentLink2URL: https://jlcpcb.com/partdetail/C147568; ComponentLink3Description: LCSC Part URL; ComponentLink3URL: https://lcsc.com/product-detail/Multilayer-Ceramic-Capacitors-MLCC---SMD-SMT_Darfon-Elec-Darfon-Elec-C1005X7R272KGTS_C147568.html
footprint CAP-0402 (0402 (1005M) Capacitor)
pins: 1, 2

## C1005X7R273KETS
designator C?  Capacitance: 27nF  (hidden comment: *)
Capacitor, Ceramic (MLCC), 27nF, ±10%, 16V, X7R, ±10%, SMD 0402; Manufacturer: Darfon Elec; Manufacturer Part Number: C1005X7R273KETS; Package Size: 0402; JLCPCB Basic Part: No; JLCPCB Part Number: C147619; Supplier 1: LCSC; Category: Capacitors - MLCC; Supplier Part Number 1: C147619; Tolerance: ±10%; Voltage Rating: 16V; Temperature Coefficient: X7R; RoHS: Yes; ComponentLink1Description: Datasheet; ComponentLink1URL: https://wmsc.lcsc.com/wmsc/upload/file/pdf/v2/lcsc/2304140030_Darfon-Elec-C1005X7R273KETS_C147619.pdf; ComponentLink2Description: JLCPCB Part URL; ComponentLink2URL: https://jlcpcb.com/partdetail/C147619; ComponentLink3Description: LCSC Part URL; ComponentLink3URL: https://lcsc.com/product-detail/Multilayer-Ceramic-Capacitors-MLCC---SMD-SMT_Darfon-Elec-Darfon-Elec-C1005X7R273KETS_C147619.html
footprint CAP-0402 (0402 (1005M) Capacitor)
pins: 1, 2

## C1005X7R301KGTS
designator C?  Capacitance: 300pF  (hidden comment: *)
Capacitor, Ceramic (MLCC), 300pF, ±10%, 50V, X7R, ±10%, SMD 0402; Manufacturer: Darfon Elec; Manufacturer Part Number: C1005X7R301KGTS; Package Size: 0402; JLCPCB Basic Part: No; JLCPCB Part Number: C267417; Supplier 1: LCSC; Category: Capacitors - MLCC; Supplier Part Number 1: C267417; Tolerance: ±10%; Voltage Rating: 50V; Temperature Coefficient: X7R; RoHS: Yes; ComponentLink1Description: Datasheet; ComponentLink1URL: https://wmsc.lcsc.com/wmsc/upload/file/pdf/v2/lcsc/2304140030_Darfon-Elec-C1005X7R301KGTS_C267417.pdf; ComponentLink2Description: JLCPCB Part URL; ComponentLink2URL: https://jlcpcb.com/partdetail/C267417; ComponentLink3Description: LCSC Part URL; ComponentLink3URL: https://lcsc.com/product-detail/Multilayer-Ceramic-Capacitors-MLCC---SMD-SMT_Darfon-Elec-Darfon-Elec-C1005X7R301KGTS_C267417.html
footprint CAP-0402 (0402 (1005M) Capacitor)
pins: 1, 2

## C1005X7R331KGTS
designator C?  Capacitance: 330pF  (hidden comment: *)
Capacitor, Ceramic (MLCC), 330pF, ±10%, 50V, X7R, ±10%, SMD 0402; Manufacturer: Darfon Elec; Manufacturer Part Number: C1005X7R331KGTS; Package Size: 0402; JLCPCB Basic Part: No; JLCPCB Part Number: C147521; Supplier 1: LCSC; Category: Capacitors - MLCC; Supplier Part Number 1: C147521; Tolerance: ±10%; Voltage Rating: 50V; Temperature Coefficient: X7R; RoHS: Yes; ComponentLink1Description: Datasheet; ComponentLink1URL: https://wmsc.lcsc.com/wmsc/upload/file/pdf/v2/lcsc/2304140030_Darfon-Elec-C1005X7R331KGTS_C147521.pdf; ComponentLink2Description: JLCPCB Part URL; ComponentLink2URL: https://jlcpcb.com/partdetail/C147521; ComponentLink3Description: LCSC Part URL; ComponentLink3URL: https://lcsc.com/product-detail/Multilayer-Ceramic-Capacitors-MLCC---SMD-SMT_Darfon-Elec-Darfon-Elec-C1005X7R331KGTS_C147521.html
footprint CAP-0402 (0402 (1005M) Capacitor)
pins: 1, 2

## C1005X7R332KGTS
designator C?  Capacitance: 3.3nF  (hidden comment: *)
Capacitor, Ceramic (MLCC), 3.3nF, ±10%, 50V, X7R, ±10%, SMD 0402; Manufacturer: Darfon Elec; Manufacturer Part Number: C1005X7R332KGTS; Package Size: 0402; JLCPCB Basic Part: No; JLCPCB Part Number: C147573; Supplier 1: LCSC; Category: Capacitors - MLCC; Supplier Part Number 1: C147573; Tolerance: ±10%; Voltage Rating: 50V; Temperature Coefficient: X7R; RoHS: Yes; ComponentLink1Description: Datasheet; ComponentLink1URL: https://wmsc.lcsc.com/wmsc/upload/file/pdf/v2/lcsc/2304140030_Darfon-Elec-C1005X7R332KGTS_C147573.pdf; ComponentLink2Description: JLCPCB Part URL; ComponentLink2URL: https://jlcpcb.com/partdetail/C147573; ComponentLink3Description: LCSC Part URL; ComponentLink3URL: https://lcsc.com/product-detail/Multilayer-Ceramic-Capacitors-MLCC---SMD-SMT_Darfon-Elec-Darfon-Elec-C1005X7R332KGTS_C147573.html
footprint CAP-0402 (0402 (1005M) Capacitor)
pins: 1, 2

## C1005X7R333KETS
designator C?  Capacitance: 33nF  (hidden comment: *)
Capacitor, Ceramic (MLCC), 33nF, ±10%, 16V, X7R, ±10%, SMD 0402; Manufacturer: Darfon Elec; Manufacturer Part Number: C1005X7R333KETS; Package Size: 0402; JLCPCB Basic Part: No; JLCPCB Part Number: C147622; Supplier 1: LCSC; Category: Capacitors - MLCC; Supplier Part Number 1: C147622; Tolerance: ±10%; Voltage Rating: 16V; Temperature Coefficient: X7R; RoHS: Yes; ComponentLink1Description: Datasheet; ComponentLink1URL: https://wmsc.lcsc.com/wmsc/upload/file/pdf/v2/lcsc/2304140030_Darfon-Elec-C1005X7R333KETS_C147622.pdf; ComponentLink2Description: JLCPCB Part URL; ComponentLink2URL: https://jlcpcb.com/partdetail/C147622; ComponentLink3Description: LCSC Part URL; ComponentLink3URL: https://lcsc.com/product-detail/Multilayer-Ceramic-Capacitors-MLCC---SMD-SMT_Darfon-Elec-Darfon-Elec-C1005X7R333KETS_C147622.html
footprint CAP-0402 (0402 (1005M) Capacitor)
pins: 1, 2

## C1005X7R391KGTS
designator C?  Capacitance: 390pF  (hidden comment: *)
Capacitor, Ceramic (MLCC), 390pF, ±10%, 50V, X7R, ±10%, SMD 0402; Manufacturer: Darfon Elec; Manufacturer Part Number: C1005X7R391KGTS; Package Size: 0402; JLCPCB Basic Part: No; JLCPCB Part Number: C147525; Supplier 1: LCSC; Category: Capacitors - MLCC; Supplier Part Number 1: C147525; Tolerance: ±10%; Voltage Rating: 50V; Temperature Coefficient: X7R; RoHS: Yes; ComponentLink1Description: Datasheet; ComponentLink1URL: https://wmsc.lcsc.com/wmsc/upload/file/pdf/v2/lcsc/2304140030_Darfon-Elec-C1005X7R391KGTS_C147525.pdf; ComponentLink2Description: JLCPCB Part URL; ComponentLink2URL: https://jlcpcb.com/partdetail/C147525; ComponentLink3Description: LCSC Part URL; ComponentLink3URL: https://lcsc.com/product-detail/Multilayer-Ceramic-Capacitors-MLCC---SMD-SMT_Darfon-Elec-Darfon-Elec-C1005X7R391KGTS_C147525.html
footprint CAP-0402 (0402 (1005M) Capacitor)
pins: 1, 2

## C1005X7R392KGTS
designator C?  Capacitance: 3.9nF  (hidden comment: *)
Capacitor, Ceramic (MLCC), 3.9nF, ±10%, 50V, X7R, ±10%, SMD 0402; Manufacturer: Darfon Elec; Manufacturer Part Number: C1005X7R392KGTS; Package Size: 0402; JLCPCB Basic Part: No; JLCPCB Part Number: C147579; Supplier 1: LCSC; Category: Capacitors - MLCC; Supplier Part Number 1: C147579; Tolerance: ±10%; Voltage Rating: 50V; Temperature Coefficient: X7R; RoHS: Yes; ComponentLink1Description: Datasheet; ComponentLink1URL: https://wmsc.lcsc.com/wmsc/upload/file/pdf/v2/lcsc/2304140030_Darfon-Elec-C1005X7R392KGTS_C147579.pdf; ComponentLink2Description: JLCPCB Part URL; ComponentLink2URL: https://jlcpcb.com/partdetail/C147579; ComponentLink3Description: LCSC Part URL; ComponentLink3URL: https://lcsc.com/product-detail/Multilayer-Ceramic-Capacitors-MLCC---SMD-SMT_Darfon-Elec-Darfon-Elec-C1005X7R392KGTS_C147579.html
footprint CAP-0402 (0402 (1005M) Capacitor)
pins: 1, 2

## C1005X7R471KGT
designator C?  Capacitance: 470pF  (hidden comment: *)
Capacitor, Ceramic (MLCC), 470pF, ±10%, 50V, X7R, ±10%, SMD 0402; Manufacturer: Darfon Elec; Manufacturer Part Number: C1005X7R471KGT; Package Size: 0402; JLCPCB Basic Part: No; JLCPCB Part Number: C382731; Supplier 1: LCSC; Category: Capacitors - MLCC; Supplier Part Number 1: C382731; Tolerance: ±10%; Voltage Rating: 50V; Temperature Coefficient: X7R; RoHS: Yes; ComponentLink1Description: Datasheet; ComponentLink1URL: https://wmsc.lcsc.com/wmsc/upload/file/pdf/v2/lcsc/2304140030_Darfon-Elec-C1005X7R471KGT_C382731.pdf; ComponentLink2Description: JLCPCB Part URL; ComponentLink2URL: https://jlcpcb.com/partdetail/C382731; ComponentLink3Description: LCSC Part URL; ComponentLink3URL: https://lcsc.com/product-detail/Multilayer-Ceramic-Capacitors-MLCC---SMD-SMT_Darfon-Elec-Darfon-Elec-C1005X7R471KGT_C382731.html
footprint CAP-0402 (0402 (1005M) Capacitor)
pins: 1, 2
